# Altium footprint library MyPcbLib.PcbLib: 237 footprints (part 2 of 15)
Each footprint in its own frame and in the unit in brackets; x right, y up, seen from the top. Pads: shape width x height; smd on the part's side, far side on the other; paste and mask are expansions set on the pad; w line width, h text height; cw(c..) or ccw(c..) is an arc to the next point about the centre after c.
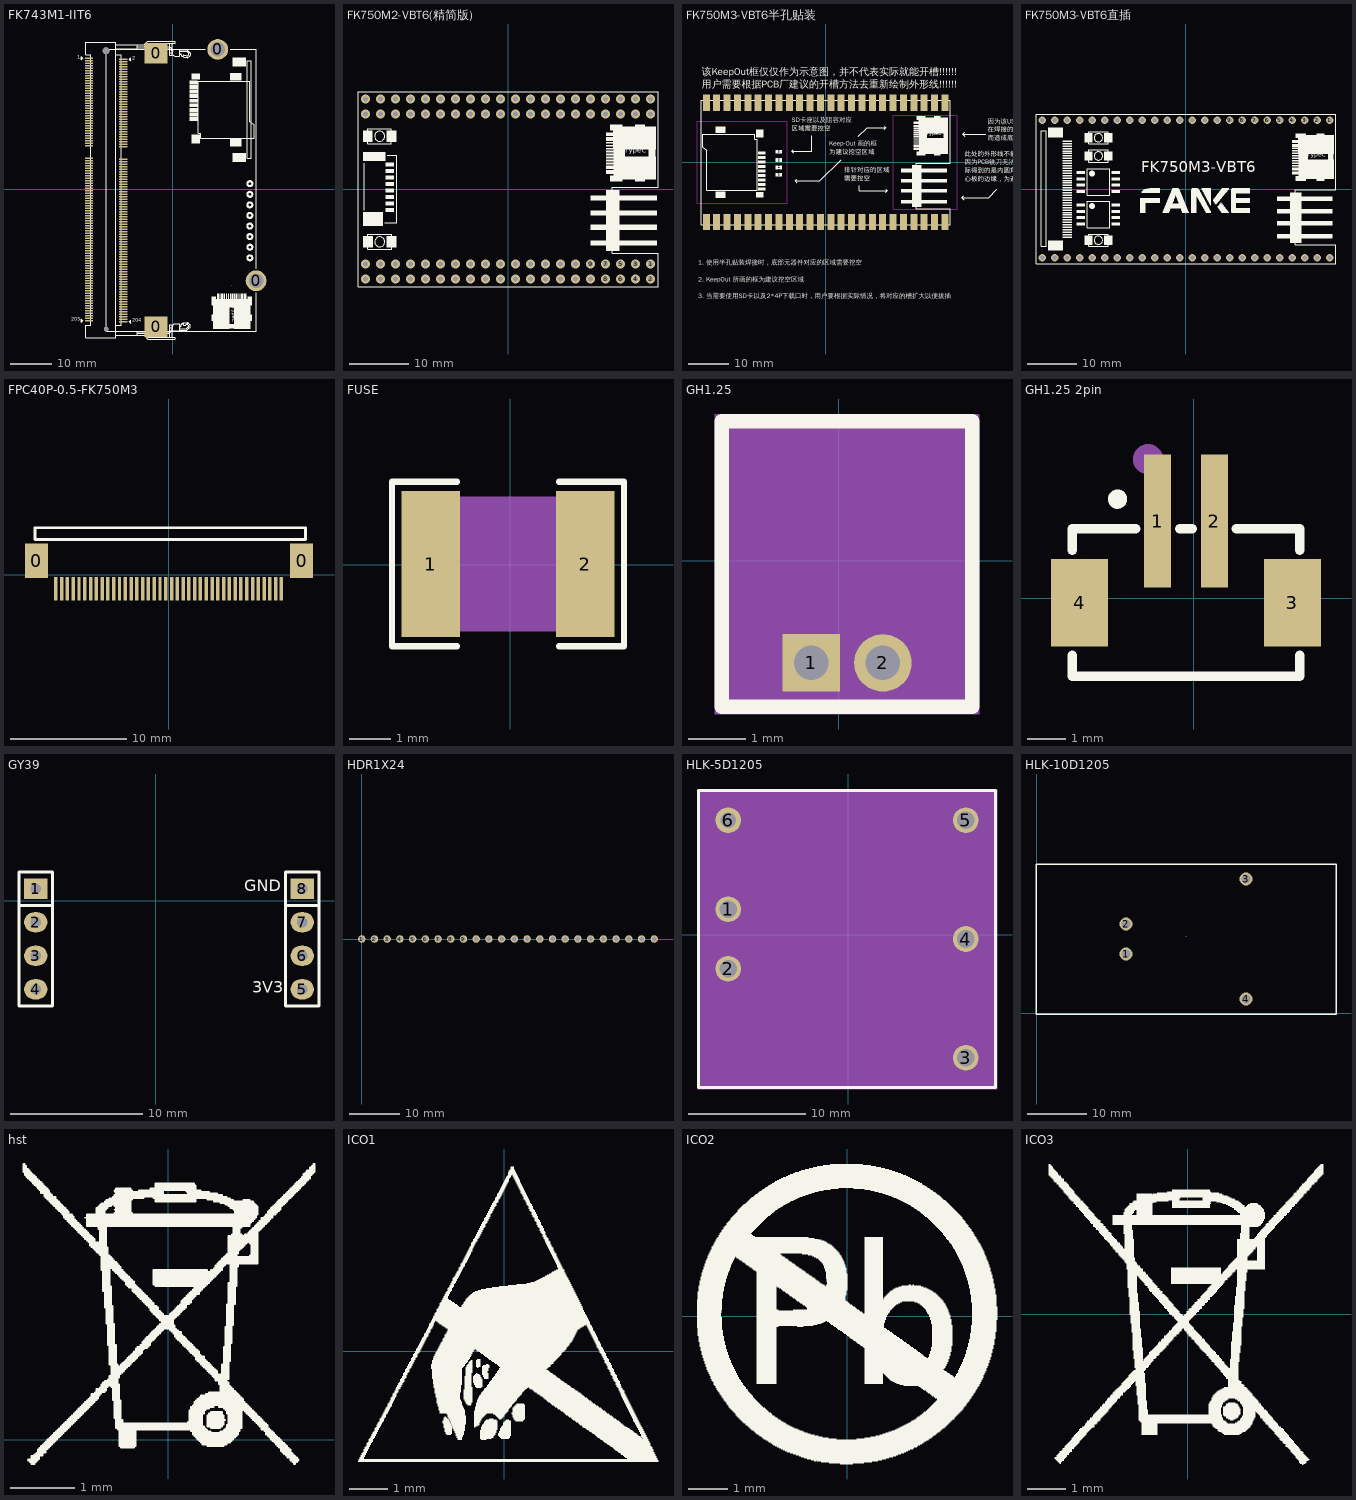
[diagram p1: the footprints below, top view; thin cyan lines are the x and y axes]

## FK743M1-IIT6 [mm]
pads (210):
  round 1.1 hole 1.1 unplated: 0(-15.951,-33.569)
  round 1.6 hole 1.6 unplated: 0(-15.951,33.231)
  rect 5.5x5 smd: 0(-3.951,-32.969) 0(-3.951,32.631)
  round 5 hole 3.5: 0(10.852,33.569) 0(20.052,-21.931)
  rect 2x0.35 smd: 1(-20.052,31.481) 2(-11.851,31.181) 3(-20.052,30.881) 4(-11.851,30.581) 5(-20.052,30.281) 6(-11.851,29.981) 7(-20.052,29.681) 8(-11.851,29.381) 9(-20.052,29.081) 10(-11.851,28.781) 11(-20.052,28.481) 12(-11.851,28.181) 13(-20.052,27.881) 14(-11.851,27.581) 15(-20.052,27.281) 16(-11.851,26.981) 17(-20.052,26.681) 18(-11.851,26.381) 19(-20.052,26.081) 20(-11.851,25.781) 21(-20.052,25.481) 22(-11.851,25.181) 23(-20.052,24.881) 24(-11.851,24.581) 25(-20.052,24.281) 26(-11.851,23.981) 27(-20.052,23.681) 28(-11.851,23.381) 29(-20.052,23.081) 30(-11.851,22.781) 31(-20.052,22.481) 32(-11.851,22.181) 33(-20.052,21.881) 34(-11.851,21.581) 35(-20.052,21.281) 36(-11.851,20.981) 37(-20.052,20.681) 38(-11.851,20.381) 39(-20.052,20.081) 40(-11.851,19.781) 41(-20.052,19.481) 42(-11.851,19.181) 43(-20.052,18.881) 44(-11.851,18.581) 45(-20.052,18.281) 46(-11.851,17.981) 47(-20.052,17.681) 48(-11.851,17.381) 49(-20.052,17.081) 50(-11.851,16.781) 51(-20.052,16.481) 52(-11.851,16.181) 53(-20.052,15.881) 54(-11.851,15.581) 55(-20.052,15.281) 56(-11.851,14.981) 57(-20.052,14.681) 58(-11.851,14.381) 59(-20.052,14.081) 60(-11.851,13.781) 61(-20.052,13.481) 62(-11.851,13.181) 63(-20.052,12.881) 64(-11.851,12.581) 65(-20.052,12.281) 66(-11.851,11.981) 67(-20.052,11.681) 68(-11.851,11.381) 69(-20.052,11.081) 70(-11.851,10.781) 71(-20.052,10.481) 72(-11.851,10.181) 73(-20.052,7.481) 74(-11.851,7.181) 75(-20.052,6.881) 76(-11.851,6.581) 77(-20.052,6.281) 78(-11.851,5.981) 79(-20.052,5.681) 80(-11.851,5.381) 81(-20.052,5.081) 82(-11.851,4.781) 83(-20.052,4.481) 84(-11.851,4.181) 85(-20.052,3.881) 86(-11.851,3.581) 87(-20.052,3.281) 88(-11.851,2.981) 89(-20.052,2.681) 90(-11.851,2.381) 91(-20.052,2.081) 92(-11.851,1.781) 93(-20.052,1.481) 94(-11.851,1.181) 95(-20.052,0.881) 96(-11.851,0.581) 97(-20.052,0.281) 98(-11.851,-0.019) 99(-20.052,-0.319) 100(-11.851,-0.619) 101(-20.052,-0.919) 102(-11.851,-1.219) 103(-20.052,-1.519) 104(-11.851,-1.819) 105(-20.052,-2.119) 106(-11.851,-2.419) 107(-20.052,-2.719) 108(-11.851,-3.019) 109(-20.052,-3.319) 110(-11.851,-3.619) 111(-20.052,-3.919) 112(-11.851,-4.219) 113(-20.052,-4.519) 114(-11.851,-4.819) 115(-20.052,-5.119) 116(-11.851,-5.419) 117(-20.052,-5.719) 118(-11.851,-6.019) 119(-20.052,-6.319) 120(-11.851,-6.619) 121(-20.052,-6.919) 122(-11.851,-7.219) 123(-20.052,-7.519) 124(-11.851,-7.819) 125(-20.052,-8.119) 126(-11.851,-8.419) 127(-20.052,-8.719) 128(-11.851,-9.019) 129(-20.052,-9.319) 130(-11.851,-9.619) 131(-20.052,-9.919) 132(-11.851,-10.219) 133(-20.052,-10.519) 134(-11.851,-10.819) 135(-20.052,-11.119) 136(-11.851,-11.419) 137(-20.052,-11.719) 138(-11.851,-12.019) 139(-20.052,-12.319) 140(-11.851,-12.619) 141(-20.052,-12.919) 142(-11.851,-13.219) 143(-20.052,-13.519) 144(-11.851,-13.819) 145(-20.052,-14.119) 146(-11.851,-14.419) 147(-20.052,-14.719) 148(-11.851,-15.019) 149(-20.052,-15.319) 150(-11.851,-15.619) 151(-20.052,-15.919) 152(-11.851,-16.219) 153(-20.052,-16.519) 154(-11.851,-16.819) 155(-20.052,-17.119) 156(-11.851,-17.419) 157(-20.052,-17.719) 158(-11.851,-18.019) 159(-20.052,-18.319) 160(-11.851,-18.619) 161(-20.052,-18.919) 162(-11.851,-19.219) 163(-20.052,-19.519) 164(-11.851,-19.819) 165(-20.052,-20.119) 166(-11.851,-20.419) 167(-20.052,-20.719) 168(-11.851,-21.019) 169(-20.052,-21.319) 170(-11.851,-21.619) 171(-20.052,-21.919) 172(-11.851,-22.219) 173(-20.052,-22.519) 174(-11.851,-22.819) 175(-20.052,-23.119) 176(-11.851,-23.419) 177(-20.052,-23.719) 178(-11.851,-24.019) 179(-20.052,-24.319) 180(-11.851,-24.619) 181(-20.052,-24.919) 182(-11.851,-25.219) 183(-20.052,-25.519) 184(-11.851,-25.819) 185(-20.052,-26.119) 186(-11.851,-26.419) 187(-20.052,-26.719) 188(-11.851,-27.019) 189(-20.052,-27.319) 190(-11.851,-27.619) 191(-20.052,-27.919) 192(-11.851,-28.219) 193(-20.052,-28.519) 194(-11.851,-28.819) 195(-20.052,-29.119) 196(-11.851,-29.419) 197(-20.052,-29.719) 198(-11.851,-30.019) 199(-20.052,-30.319) 200(-11.851,-30.619) 201(-20.052,-30.919) 202(-11.851,-31.219) 203(-20.052,-31.519) 204(-11.851,-31.819)
Top Overlay:
  drawing of 259 lines, arcs and shapes, not listed
  text "204" at -9.691,-32.183 h1.52
  text "203" at -24.258,-31.929 h1.52
  text "2" at -9.615,30.769 h1.52
  text "1" at -22.822,31.01 h1.52
  text "TypeC" at 13.92,-28.189 h1.52
3D body "FK743M1-IIT6-V1.0.step": height 7.16, standoff 0.93, extent -15.964,-34.039 20.036,33.561
3D body "DDR3 SODIMM-204Pin.STEP": height 5.65, standoff -0.5, extent -20.969,-35.967 5.571,35.633

## FK750M2-VBT6(精简版) [mm]
pads (80):
  round 1.5 hole 0.9: 1(24.13,-12.7) 2(24.13,-15.24) 3(21.59,-12.7) 4(21.59,-15.24) 5(19.05,-12.7) 6(19.05,-15.24) 7(16.51,-12.7) 8(16.51,-15.24) 9(13.97,-12.7) 10(13.97,-15.24) 11(11.43,-12.7) 12(11.43,-15.24) 13(8.89,-12.7) 14(8.89,-15.24) 15(6.35,-12.7) 16(6.35,-15.24) 17(3.81,-12.7) 18(3.81,-15.24) 19(1.27,-12.7) 20(1.27,-15.24) 21(-1.27,-12.7) 22(-1.27,-15.24) 23(-3.81,-12.7) 24(-3.81,-15.24) 25(-6.35,-12.7) 26(-6.35,-15.24) 27(-8.89,-12.7) 28(-8.89,-15.24) 29(-11.43,-12.7) 30(-11.43,-15.24) 31(-13.97,-12.7) 32(-13.97,-15.24) 33(-16.51,-12.7) 34(-16.51,-15.24) 35(-19.05,-12.7) 36(-19.05,-15.24) 37(-21.59,-12.7) 38(-21.59,-15.24) 39(-24.13,-12.7) 40(-24.13,-15.24) 41(24.13,15.24) 42(24.13,12.7) 43(21.59,15.24) 44(21.59,12.7) 45(19.05,15.24) 46(19.05,12.7) 47(16.51,15.24) 48(16.51,12.7) 49(13.97,15.24) 50(13.97,12.7) 51(11.43,15.24) 52(11.43,12.7) 53(8.89,15.24) 54(8.89,12.7) 55(6.35,15.24) 56(6.35,12.7) 57(3.81,15.24) 58(3.81,12.7) 59(1.27,15.24) 60(1.27,12.7) 61(-1.27,15.24) 62(-1.27,12.7) 63(-3.81,15.24) 64(-3.81,12.7) 65(-6.35,15.24) 66(-6.35,12.7) 67(-8.89,15.24) 68(-8.89,12.7) 69(-11.43,15.24) 70(-11.43,12.7) 71(-13.97,15.24) 72(-13.97,12.7) 73(-16.51,15.24) 74(-16.51,12.7) 75(-19.05,15.24) 76(-19.05,12.7) 77(-21.59,15.24) 78(-21.59,12.7) 79(-24.13,15.24) 80(-24.13,12.7)
Top Overlay:
  circle w0.15: c-21.721,-8.946 r0.85
  circle w0.15: c-21.733,8.936 r0.85
  rectangle: -24.545,-9.912 -22.894,-7.994
  rectangle: -20.545,-9.899 -18.894,-7.994
  rectangle: -24.558,7.969 -22.907,9.887
  rectangle: -20.557,7.982 -18.906,9.887
  rectangle: -24.536,4.756 -20.777,6.254
  rectangle: -24.536,-6.268 -21.17,-3.906
  rectangle: -20.777,2.698 -19.265,3.409
  rectangle: -20.777,0.501 -19.265,1.2
  rectangle: -20.777,-1.696 -19.278,-0.998
  rectangle: -20.777,-3.893 -19.265,-3.195
  rectangle: -20.777,3.803 -19.265,4.502
  rectangle: -20.777,1.593 -19.265,2.304
  rectangle: -20.777,-0.604 -19.278,0.107
  rectangle: -20.777,-2.801 -19.265,-2.09
  rectangle: 17.285,9.924 19.419,10.915
  rectangle: 21.54,9.928 23.165,10.915
  rectangle: 17.285,1.238 19.419,2.266
  rectangle: 21.54,1.238 23.165,2.368
  rectangle: 23.826,5.225 24.956,6.978
  rectangle: 17.831,5.352 19.825,6.978
  rectangle: 17.831,1.619 25.045,5.543
  rectangle: 17.819,6.673 25.045,10.559
  rectangle: 16.561,4.171 17.857,4.476
  rectangle: 16.561,4.667 17.857,4.971
  rectangle: 16.561,5.175 17.857,5.479
  rectangle: 16.561,5.67 17.857,5.975
  rectangle: 16.561,6.178 17.857,6.483
  rectangle: 16.561,6.673 17.857,6.978
  rectangle: 16.561,7.169 17.857,7.473
  rectangle: 16.561,7.677 17.857,7.981
  rectangle: 16.561,2.558 17.908,3.181
  rectangle: 16.561,3.359 17.908,3.981
  rectangle: 16.561,8.159 17.908,8.781
  rectangle: 16.561,8.947 17.958,9.582
  rectangle: 13.958,-9.595 25.261,-8.706
  rectangle: 13.958,-6.928 25.261,-6.039
  rectangle: 13.958,-4.515 25.261,-3.626
  rectangle: 13.958,-1.975 25.261,-1.086
  rectangle: 16.625,-10.484 18.911,-0.197
  lines w0.1: -24.321,-3.576 -24.321,4.324 ; -20.848,-5.698 -18.843,-5.698 -18.843,5.696 -20.448,5.696
  lines w0.127: -23.733,7.686 -23.733,10.186 -19.733,10.186 -19.733,7.686 -23.733,7.686 ; -23.721,-10.196 -23.721,-7.696 -19.721,-7.696 -19.721,-10.196 -23.721,-10.196
  lines w0.152: -25.4,-16.51 25.4,-16.51 25.4,-10.847 17.632,-10.847 17.632,0.329 25.4,0.329 25.4,16.51 -25.4,16.51 -25.4,-16.51
  text "TypeC" at 19.698,5.809 h1.52
3D body "FK750M2-VBT6-V1.0.step": height 8.36, standoff 1.86, extent -25.4,-16.51 25.4,16.51

## FK750M3-VBT6半孔贴装 [mm]
pads (48):
  rect 1.7x4 smd: 1(29.21,14.605) 2(26.67,14.605) 3(24.13,14.605) 4(21.59,14.605) 5(19.05,14.605) 6(16.51,14.605) 7(13.97,14.605) 8(11.43,14.605) 9(8.89,14.605) 10(6.35,14.605) 11(3.81,14.605) 12(1.27,14.605) 13(-1.27,14.605) 14(-3.81,14.605) 15(-6.35,14.605) 16(-8.89,14.605) 17(-11.43,14.605) 18(-13.97,14.605) 19(-16.51,14.605) 20(-19.05,14.605) 21(-21.59,14.605) 22(-24.13,14.605) 23(-26.67,14.605) 24(-29.21,14.605) 25(29.21,-14.605) 26(26.67,-14.605) 27(24.13,-14.605) 28(21.59,-14.605) 29(19.05,-14.605) 30(16.51,-14.605) 31(13.97,-14.605) 32(11.43,-14.605) 33(8.89,-14.605) 34(6.35,-14.605) 35(3.81,-14.605) 36(1.27,-14.605) 37(-1.27,-14.605) 38(-3.81,-14.605) 39(-6.35,-14.605) 40(-8.89,-14.605) 41(-11.43,-14.605) 42(-13.97,-14.605) 43(-16.51,-14.605) 44(-19.05,-14.605) 45(-21.59,-14.605) 46(-24.13,-14.605) 47(-26.67,-14.605) 48(-29.21,-14.605)
Top Overlay:
  region: -14.694,1.491 -16.51,1.491 -16.51,0.792 -14.694,0.792
  region: -15.215,7.988 -17.005,7.988 -17.005,6.096 -15.215,6.096
  region: -14.694,-2.909 -16.51,-2.909 -16.51,-3.608 -14.694,-3.608
  region: -14.694,-0.709 -16.51,-0.709 -16.51,-1.408 -14.694,-1.408
  region: -14.694,2.591 -16.51,2.591 -16.51,1.892 -14.694,1.892
  region: -14.694,0.391 -16.51,0.391 -16.51,-0.308 -14.694,-0.308
  region: -14.694,-1.809 -16.51,-1.809 -16.51,-2.508 -14.694,-2.508
  region: -14.694,-4.009 -16.51,-4.009 -16.51,-4.708 -14.694,-4.708
  region: -14.694,-6.209 -16.51,-6.209 -16.51,-6.908 -14.694,-6.908
  region: -14.694,-5.109 -16.51,-5.109 -16.51,-5.808 -14.694,-5.808
  region: -15.202,-7.302 -17.005,-7.302 -17.005,-8.611 -15.202,-8.611
  region: -11.684,3.048 -12.319,3.048 -12.319,2.159 -11.684,2.159
  region: -11.671,-0.826 -12.306,-0.826 -12.306,-1.714 -11.671,-1.714
  region: -11.684,-2.616 -12.319,-2.616 -12.319,-3.505 -11.684,-3.505
  region: -11.684,1.003 -12.319,1.003 -12.319,0.114 -11.684,0.114
  region: -24.46,8.738 -26.949,8.738 -26.949,7.15 -24.46,7.15
  region: -24.46,-7.163 -26.949,-7.163 -26.949,-8.738 -24.46,-8.738
  region: -10.668,3.048 -11.303,3.048 -11.303,2.159 -10.668,2.159
  region: -10.655,-0.826 -11.29,-0.826 -11.29,-1.714 -10.655,-1.714
  region: -10.668,-2.616 -11.303,-2.616 -11.303,-3.505 -10.668,-3.505
  region: -10.668,1.003 -11.303,1.003 -11.303,0.114 -10.668,0.114
  rectangle: 18.466,-10.065 29.769,-9.176
  rectangle: 18.466,-7.398 29.769,-6.509
  rectangle: 18.466,-4.985 29.769,-4.096
  rectangle: 18.466,-2.445 29.769,-1.556
  rectangle: 21.133,-10.954 23.419,-0.667
  rectangle: 26.518,10.342 28.143,11.328
  rectangle: 21.539,9.36 22.936,9.995
  rectangle: 21.539,8.572 22.885,9.195
  rectangle: 21.539,3.772 22.885,4.394
  rectangle: 21.539,2.972 22.885,3.594
  rectangle: 21.539,8.09 22.835,8.395
  rectangle: 21.539,7.582 22.835,7.887
  rectangle: 21.539,7.087 22.835,7.391
  rectangle: 21.539,6.591 22.835,6.896
  rectangle: 21.539,6.083 22.835,6.388
  rectangle: 21.539,5.588 22.835,5.893
  rectangle: 21.539,5.08 22.835,5.385
  rectangle: 21.539,4.585 22.835,4.889
  rectangle: 28.804,5.639 29.934,7.391
  rectangle: 26.518,1.651 28.143,2.781
  rectangle: 22.263,1.651 24.397,2.68
  rectangle: 22.263,10.338 24.397,11.328
  rectangle: 22.809,5.766 24.803,7.391
  rectangle: 22.797,7.087 30.023,10.973
  rectangle: 22.809,2.032 30.023,5.956
  lines w0.102: -11.611,-3.284 -11.383,-3.284 ; -11.611,-2.776 -11.383,-2.776 ; -11.611,0.335 -11.383,0.335 ; -11.611,0.843 -11.383,0.843 ; -11.611,2.38 -11.383,2.38 ; -11.611,2.888 -11.383,2.888 ; -11.598,-1.494 -11.37,-1.494 ; -11.598,-0.986 -11.37,-0.986
  lines w0.127: -7.874,2.286 -8.255,2.667 ; -7.874,3.048 -8.255,2.667 ; -3.429,6.477 -3.429,2.667 -8.255,2.667 ; 8.255,-5.715 8.255,-6.985 15.113,-6.985 ; 14.732,-7.366 15.113,-6.985 ; 14.732,-6.604 15.113,-6.985
  lines w0.152: -7.112,-4.953 -7.493,-4.572 ; -7.112,-4.191 -7.493,-4.572 ; 3.81,0.635 -1.397,-4.572 -7.493,-4.572 ; 8.001,6.35 10.16,8.509 14.732,8.509 ; 14.351,8.128 14.732,8.509 ; 14.351,8.89 14.732,8.509 ; 33.598,6.858 34.11,7.37 ; 33.782,-9.144 33.294,-8.656 33.294,-8.616 ; 33.782,-8.128 33.294,-8.616 ; 34.11,6.354 33.606,6.858 39.243,6.858 ; 41.963,-6.608 39.955,-8.616 33.274,-8.616 33.294,-8.616 ; -30.48,-15.24 30.48,-15.24 30.48,-11.358 22.216,-11.358 22.216,-0.182 30.48,-0.182 30.48,15.24 -30.48,15.24 -30.48,-15.24 ; -30.48,-15.24 -30.48,-15.24 ; -30.125,3.647 -30.125,6.847 -17.704,6.847 -17.323,6.847 -17.323,5.704 -16.688,5.704 -16.688,5.069 -16.688,-6.412 -16.688,-6.869 -29.058,-6.869 -29.058,2.91 -30.125,3.647 ; 30.55,6.731 30.558,6.731 30.55,6.731
  text "因为该USB端子的固定引脚是直插的， / 在焊接的时候，可能会因为锡渗入底部 / 而造成底部不平整，所以建议挖空" at 39.677,4.949 h2.03
  text "此处的外形线不能贴着核心板的边线， / 因为PCB铣刀无法加工出内直角，实 / 际得到的是内圆角，加上排针临近核 / 心板的边缘，为避免干涉，需要当拉宽" at 34.089,-5.084 h2.03
  text "1. 使用半孔贴装焊接时，底部元器件对应的区域需要挖空 /  / 2. KeepOut 所画的框为建议挖空区域 /  / 3. 当需要使用SD卡以及2*4P下载口时，用户要根据实际情况，将对应的槽扩大以便拔插" at -31.242,-33.742 h2.03
  text "该KeepOut框仅仅作为示意图，并不代表实际就能开槽!!!!!! / 用户需要根据PCB厂建议的开槽方法去重新绘制外形线!!!!!!" at -30.353,17.629 h3.05
  text "Keep-Out 画的框 / 为建议挖空区域" at 0.889,1.524 h2.03
  text "排针对应的区域 / 需要挖空" at 4.572,-4.953 h2.03
  text "TypeC" at 24.676,6.223 h1.52
  text "SD卡座以及阻容对应 / 区域需要挖空" at -8.255,7.239 h2.03
Keep-Out Layer:
  lines w0.152: -31.496,-10.033 -9.398,-10.033 -9.398,10.033 -31.496,10.033 -31.496,-10.033
  lines w0.203: 16.51,-11.43 32.258,-11.43 32.258,11.557 16.51,11.557 16.51,-11.43
3D body "FK750M3-VBT6-V1.0.step": height 3.86, standoff -2.64, extent -30.48,-15.24 30.48,15.24

## FK750M3-VBT6直插 [mm]
pads (48):
  round 1.5 hole 0.9: 1(29.21,13.97) 2(26.67,13.97) 3(24.13,13.97) 4(21.59,13.97) 5(19.05,13.97) 6(16.51,13.97) 7(13.97,13.97) 8(11.43,13.97) 9(8.89,13.97) 10(6.35,13.97) 11(3.81,13.97) 12(1.27,13.97) 13(-1.27,13.97) 14(-3.81,13.97) 15(-6.35,13.97) 16(-8.89,13.97) 17(-11.43,13.97) 18(-13.97,13.97) 19(-16.51,13.97) 20(-19.05,13.97) 21(-21.59,13.97) 22(-24.13,13.97) 23(-26.67,13.97) 24(-29.21,13.97) 25(29.21,-13.97) 26(26.67,-13.97) 27(24.13,-13.97) 28(21.59,-13.97) 29(19.05,-13.97) 30(16.51,-13.97) 31(13.97,-13.97) 32(11.43,-13.97) 33(8.89,-13.97) 34(6.35,-13.97) 35(3.81,-13.97) 36(1.27,-13.97) 37(-1.27,-13.97) 38(-3.81,-13.97) 39(-6.35,-13.97) 40(-8.89,-13.97) 41(-11.43,-13.97) 42(-13.97,-13.97) 43(-16.51,-13.97) 44(-19.05,-13.97) 45(-21.59,-13.97) 46(-24.13,-13.97) 47(-26.67,-13.97) 48(-29.21,-13.97)
Top Overlay:
  drawing of 913 lines, arcs and shapes, not listed
  text "FK750M3-VBT6" at -9.068,2.553 h3.81
  text "TypeC" at 24.676,6.223 h1.52
3D body "FK750M3-VBT6-V1.0排针.step": height 14.36, standoff 0.26, extent -30.48,-15.24 30.48,15.24

## FPC40P-0.5-FK750M3 [mm]
pads (42):
  rect 2x3 smd: 0(-11.465,1.202) 0(11.465,1.202)
  rect 0.3x2 smd: 1(9.721,-1.202) 2(9.221,-1.202) 3(8.721,-1.202) 4(8.221,-1.202) 5(7.721,-1.202) 6(7.221,-1.202) 7(6.721,-1.202) 8(6.221,-1.202) 9(5.721,-1.202) 10(5.221,-1.202) 11(4.721,-1.202) 12(4.221,-1.202) 13(3.721,-1.202) 14(3.221,-1.202) 15(2.721,-1.202) 16(2.221,-1.202) 17(1.721,-1.202) 18(1.221,-1.202) 19(0.721,-1.202) 20(0.221,-1.202) 21(-0.279,-1.202) 22(-0.779,-1.202) 23(-1.279,-1.202) 24(-1.779,-1.202) 25(-2.279,-1.202) 26(-2.779,-1.202) 27(-3.279,-1.202) 28(-3.779,-1.202) 29(-4.279,-1.202) 30(-4.779,-1.202) 31(-5.279,-1.202) 32(-5.779,-1.202) 33(-6.279,-1.202) 34(-6.779,-1.202) 35(-7.279,-1.202) 36(-7.779,-1.202) 37(-8.279,-1.202) 38(-8.779,-1.202) 39(-9.279,-1.202) 40(-9.779,-1.202)
Top Overlay:
  lines w0.254: -11.585,3.049 -11.585,4.065 11.815,4.065 11.815,3.049 -11.585,3.049
3D body "User Library-FPC-40-2.STEP": height 1.95, standoff 0, extent -12.23,-1.755 12.17,4.545

## FUSE [mm]
pads (2):
  rect 1.407x3.499 smd: 1(-1.913,0.022) 2(1.794,0.022)
Top Overlay:
  lines w0.152: -1.286,-1.956 -2.845,-1.956 -2.845,2.001 -1.286,2.001 ; 1.167,-1.956 2.726,-1.956 2.726,2.001 1.167,2.001
Top Paste:
  region: 1.09,-1.627 1.09,-0.672 1.19,-0.572 1.469,-0.572 1.569,-0.472 1.569,0.517 1.469,0.617 1.19,0.617 1.09,0.717 1.09,1.672 1.19,1.772 2.397,1.772 2.497,1.672 2.497,-1.627 2.397,-1.727 1.19,-1.727
  region: -1.21,-1.627 -1.21,-0.672 -1.31,-0.572 -1.588,-0.572 -1.688,-0.472 -1.688,0.517 -1.588,0.617 -1.31,0.617 -1.21,0.717 -1.21,1.672 -1.31,1.772 -2.516,1.772 -2.616,1.672 -2.616,-1.627 -2.516,-1.727 -1.31,-1.727
Mechanical 4:
  region: -2.335,-1.598 -2.335,1.642 2.215,1.642 2.215,-1.598
Mechanical 5:
  region: -2.335,-1.598 -2.335,1.642 -1.585,1.642 -1.585,-1.598
  region: 2.215,-1.598 2.215,1.642 1.465,1.642 1.465,-1.598
Mechanical 6:
  circle w0.06: c-2.335,-1.598 r0.03
Mechanical 15:
  lines w0.003: -0.085,0.399 -0.034,0.449

## GH1.25 [mm]
pads (2):
  rect 1x1 hole 0.6: 1(-0.482,-1.778)
  round 1 hole 0.6: 2(0.768,-1.778)
Top Overlay:
  lines w0.254: -2.032,-2.54 2.318,-2.54 2.318,2.422 -2.032,2.422 -2.032,-2.54
Mechanical 4:
  region: -2.159,2.549 2.445,2.549 2.445,-2.667 -2.159,-2.667
Mechanical 5:
  region: -0.982,-1.278 0.018,-1.278 0.018,-2.278 -0.982,-2.278
  region: 0.268,-1.278 1.268,-1.278 1.268,-2.278 0.268,-2.278
Mechanical 15:
  lines w0.003: 0.118,0.387 0.168,0.438

## GH1.25 2pin [mm]
pads (4):
  rect 0.7x3.5 smd: 1(-0.955,2.034) 2(0.545,2.034)
  rect 1.5x2.3 smd: 3(2.595,-0.116) 4(-3.005,-0.116)
Top Overlay:
  circle w0.254: c-2.007,2.61 r0.127
  lines w0.254: -3.205,-1.497 -3.205,-2.054 2.795,-2.054 2.795,-1.497 ; -3.205,1.265 -3.205,1.834 -1.536,1.834 ; -0.374,1.834 -0.036,1.834 ; 1.126,1.834 2.794,1.834 2.794,1.265
Mechanical 15:
  circle w0.4: c-1.205,3.659 r0.2

## GY39 [mil]
pads (8):
  rect 70x60 hole 32: 1(-357.99,35.43) 8(437.01,35.43)
  oval 70x60 hole 32: 2(-357.99,-64.57) 3(-357.99,-164.57) 4(-357.99,-264.57) 5(437.01,-264.57) 6(437.01,-164.57) 7(437.01,-64.57)
Top Overlay:
  lines w10: -407.99,-14.57 -307.99,-14.57 ; 387.01,-14.57 487.01,-14.57 ; -407.99,-314.57 -407.99,85.43 -307.99,85.43 -307.99,-314.57 -407.99,-314.57 ; 387.01,-314.57 387.01,85.43 487.01,85.43 487.01,-314.57 387.01,-314.57
  text "3V3" at 287.4,-286.74 h60
  text "GND" at 263.78,16.41 h60
3D body "Female-Header-2.54-Single-4.stp": height 334.65, standoff -125.98, extent 392.8,-319.49 491.23,90.36
3D body "Female-Header-2.54-Single-4.stp": height 334.65, standoff -125.98, extent -402.2,-319.49 -303.77,90.36

## HDR1X24 [mm] "Connector; Header; 24 Position"
pads (24):
  round 1.5 hole 0.9: 1(0,0) 2(2.54,0) 3(5.08,0) 4(7.62,0) 5(10.16,0) 6(12.7,0) 7(15.24,0) 8(17.78,0) 9(20.32,0) 10(22.86,0) 11(25.4,0) 12(27.94,0) 13(30.48,0) 14(33.02,0) 15(35.56,0) 16(38.1,0) 17(40.64,0) 18(43.18,0) 19(45.72,0) 20(48.26,0) 21(50.8,0) 22(53.34,0) 23(55.88,0) 24(58.42,0)

## HLK-5D1205 [mil]
pads (6):
  round 86.61 hole 59.06: 1(-405,85) 2(-405,-115) 3(395,-415) 4(395,-15) 5(395,385)
  round 86.61 hole 52: 6(-405,385)
Top Overlay:
  lines w10: -505,-515 495,-515 495,485 -505,485 -505,-515
Mechanical 4:
  region: -510,490 500,490 500,-520 -510,-520
Mechanical 5:
  region: -448.31,128.31 -361.69,128.31 -361.69,41.69 -448.31,41.69
  region: -448.31,-71.69 -361.69,-71.69 -361.69,-158.31 -448.31,-158.31
  region: -448.31,428.31 -361.69,428.31 -361.69,341.69 -448.31,341.69
  region: 351.69,428.31 438.31,428.31 438.31,341.69 351.69,341.69
  region: 351.69,-371.69 438.31,-371.69 438.31,-458.31 351.69,-458.31
  region: 351.69,28.31 438.31,28.31 438.31,-58.31 351.69,-58.31
Mechanical 15:
  lines w0.1: -6,2.75 -4,4.75

## HLK-10D1205 [mm]
pads (4):
  round 2.2 hole 1.5: 1(15.113,10.033) 2(15.113,15.113) 3(35.433,22.733) 4(35.433,2.413)
Top Overlay:
  lines w0.254: -0.127,-0.127 -0.127,25.273 50.673,25.273 50.673,-0.127 -0.127,-0.127
Mechanical 15:
  lines w0.003: 25.273,13.049 25.273,13.05

## hst [mm]
Top Overlay:
  drawing of 1279 lines, arcs and shapes, not listed

## ICO1 [mm]
Top Overlay:
  drawing of 990 lines, arcs and shapes, not listed

## ICO2 [mm]
Top Overlay:
  drawing of 960 lines, arcs and shapes, not listed

## ICO3 [mm]
Top Overlay:
  drawing of 1026 lines, arcs and shapes, not listed